# Altium footprint library Connectors.PcbLib: 408 footprints (part 13 of 26)
Each footprint in its own frame and in the unit in brackets; x right, y up, seen from the top. Pads: shape width x height; smd on the part's side, far side on the other; paste and mask are expansions set on the pad; w line width, h text height; cw(c..) or ccw(c..) is an arc to the next point about the centre after c.
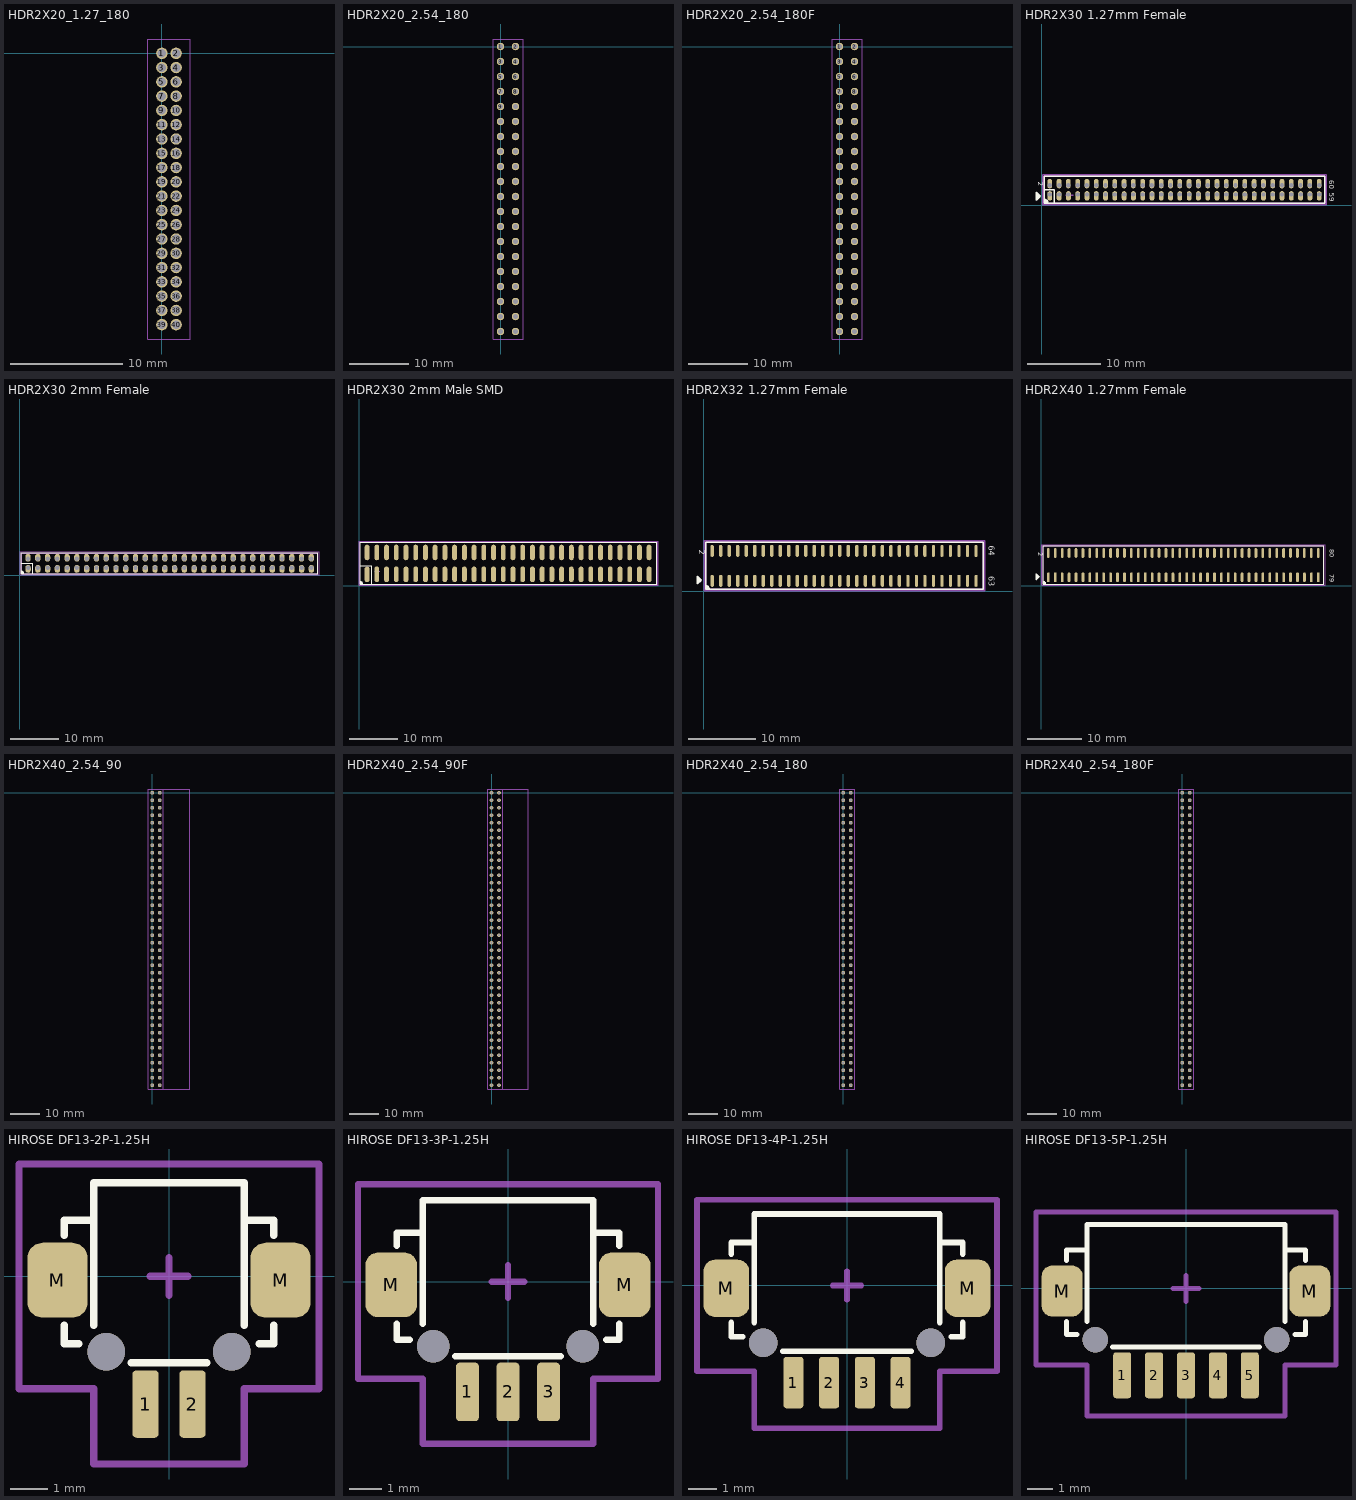
[diagram p12: the footprints below, top view; thin cyan lines are the x and y axes]

## HDR2X20_1.27_180 [mil]
height 169.29
pads (40):
  round 40 hole 30: 1(0,0) 2(50,0) 3(0,-50) 4(50,-50) 5(0,-100) 6(50,-100) 7(0,-150) 8(50,-150) 9(0,-200) 10(50,-200) 11(0,-250) 12(50,-250) 13(0,-300) 14(50,-300) 15(0,-350) 16(50,-350) 17(0,-400) 18(50,-400) 19(0,-450) 20(50,-450) 21(0,-500) 22(50,-500) 23(0,-550) 24(50,-550) 25(0,-600) 26(50,-600) 27(0,-650) 28(50,-650) 29(0,-700) 30(50,-700) 31(0,-750) 32(50,-750) 33(0,-800) 34(50,-800) 35(0,-850) 36(49.99,-850) 37(-0.01,-900) 38(49.99,-900) 39(-0.01,-950) 40(49.99,-950)
Mechanical 13:
  lines w2: -50,-1000 100,-1000 100,50 -50,50 -50,-1000
Mechanical 14:
  lines w2: -50,-1000 100,-1000 100,50 -50,50 -50,-1000
  text ".Designator" at -6,-495 h80

## HDR2X20_2.54_180 [mil]
height 169.29
pads (40):
  round 50 hole 32: 1(0,0) 2(100,0) 3(0,-100) 4(100,-100) 5(0,-200) 6(100,-200) 7(0,-300) 8(100,-300) 9(0,-400) 10(100,-400) 11(0,-500) 12(100,-500) 13(0,-600) 14(100,-600) 15(0,-700) 16(100,-700) 17(0,-800) 18(100,-800) 19(0,-900) 20(100,-900) 21(0,-1000) 22(100,-1000) 23(0,-1100) 24(100,-1100) 25(0,-1200) 26(100,-1200) 27(0,-1300) 28(100,-1300) 29(0,-1400) 30(100,-1400) 31(0,-1500) 32(100,-1500) 33(0,-1600) 34(100,-1600) 35(0,-1700) 36(100,-1700) 37(0,-1800) 38(100,-1800) 39(0,-1900) 40(100,-1900)
Mechanical 13:
  lines w2: -50,-1950 -50,50 150,50 150,-1950 -50,-1950
Mechanical 14:
  lines w2: -50,-1950 -50,50 150,50 150,-1950 -50,-1950
  text ".Designator" at 19,-970 h80
3D body "pin_header_awl254-dg-g40d.stp": height 334.65, standoff -118.11, extent -49.99,-1950 150.01,50

## HDR2X20_2.54_180F [mil]
height 169.29
pads (40):
  round 50 hole 32: 1(0,0) 2(100,0) 3(0,-100) 4(100,-100) 5(0,-200) 6(100,-200) 7(0,-300) 8(100,-300) 9(0,-400) 10(100,-400) 11(0,-500) 12(100,-500) 13(0,-600) 14(100,-600) 15(0,-700) 16(100,-700) 17(0,-800) 18(100,-800) 19(0,-900) 20(100,-900) 21(0,-1000) 22(100,-1000) 23(0,-1100) 24(100,-1100) 25(0,-1200) 26(100,-1200) 27(0,-1300) 28(100,-1300) 29(0,-1400) 30(100,-1400) 31(0,-1500) 32(100,-1500) 33(0,-1600) 34(100,-1600) 35(0,-1700) 36(100,-1700) 37(0,-1800) 38(100,-1800) 39(0,-1900) 40(100,-1900)
Mechanical 13:
  lines w2: -50,-1950 -50,50 150,50 150,-1950 -50,-1950
Mechanical 14:
  lines w2: -50,-1950 150,-1950 150,50 -50,50 -50,-1950
  text ".Designator" at 19,-970 h80
3D body "female_header_a-bl254-dg-g40d.stp": height 334.65, standoff -125.98, extent -48.42,-1954.92 148.43,54.92

## HDR2X30 1.27mm Female [mm]
pads (60):
  oval 0.65x1.3 hole 0.6 copper offset 0,-0.2: 1(1.09,1.5) 3(2.36,1.5) 5(3.631,1.5) 7(4.901,1.5) 9(6.171,1.5) 11(7.442,1.5) 13(8.712,1.5) 15(9.982,1.5) 17(11.253,1.5) 19(12.523,1.5) 21(13.793,1.5) 23(15.064,1.5) 25(16.334,1.5) 27(17.604,1.5) 29(18.875,1.5) 31(20.145,1.5) 33(21.415,1.5) 35(22.686,1.5) 37(23.956,1.5) 39(25.226,1.5) 41(26.497,1.5) 43(27.767,1.5) 45(29.037,1.5) 47(30.308,1.5) 49(31.578,1.5) 51(32.848,1.5) 53(34.119,1.5) 55(35.389,1.5) 57(36.659,1.5) 59(37.93,1.5)
  oval 0.65x1.3 hole 0.6 copper offset 0,0.2: 2(1.083,2.78) 4(2.354,2.78) 6(3.624,2.78) 8(4.894,2.78) 10(6.165,2.78) 12(7.435,2.78) 14(8.705,2.78) 16(9.976,2.78) 18(11.246,2.78) 20(12.516,2.78) 22(13.787,2.78) 24(15.057,2.78) 26(16.327,2.78) 28(17.598,2.78) 30(18.868,2.78) 32(20.138,2.78) 34(21.409,2.78) 36(22.679,2.78) 38(23.949,2.78) 40(25.22,2.78) 42(26.49,2.78) 44(27.76,2.78) 46(29.031,2.78) 48(30.301,2.78) 50(31.571,2.78) 52(32.842,2.78) 54(34.112,2.78) 56(35.382,2.78) 58(36.653,2.78) 90(37.923,2.78)
Top Overlay:
  rectangle: -0.73,0.92 -0.48,1.65
  rectangle: -0.56,1.06 -0.31,1.5
  region: 0.25,0.3 0.25,0.78 0.5,0.78 0.79,0.49 0.79,0.3
  lines w0.2: 0.3,0.82 cw(c0.3,0.32) 0.8,0.32 ; 0.3,2.15 1.73,2.15 1.73,0.37 ; 0.34,0.64 0.37,0.64 cw(c0.37,0.3) 0.71,0.3 ; -0.74,0.72 -0.19,1.27 -0.74,1.82 -0.74,0.72 ; 0.3,0.3 0.3,3.99 38.69,3.99 38.69,0.3 0.3,0.3
  text "2" at -0.8,3.22 h1.2
  text "60" at 39.03,3.47 h1.2
  text "59" at 39.03,1.73 h1.2
Mechanical 13:
  lines w0.2: 0.32,0.31 38.69,0.31 38.69,3.97 0.32,3.97 0.32,0.31
Mechanical 15:
  lines w0.2: 3.28,1.36 4.28,1.36 ; 3.78,0.86 3.78,1.86 ; 0.09,0.08 0.09,4.21 38.91,4.21 38.91,0.08 0.09,0.08
3D body "2002111100060T4LF.stp": height 5.5, standoff -2.35, extent 0.46,0.44 38.56,3.84

## HDR2X30 2mm Female [mm]
pads (60):
  oval 1.1x1.6 hole 0.9 copper offset 0,-0.2: 1(1.666,1.51) 3(3.674,1.51) 5(5.683,1.51) 7(7.691,1.51) 9(9.699,1.51) 11(11.708,1.51) 13(13.716,1.51) 15(15.724,1.51) 17(17.733,1.51) 19(19.741,1.51) 21(21.749,1.51) 23(23.758,1.51) 25(25.766,1.51) 27(27.774,1.51) 29(29.783,1.51) 31(31.791,1.51) 33(33.806,1.51) 35(35.814,1.51) 37(37.823,1.51) 39(39.831,1.51) 41(41.839,1.51) 43(43.848,1.51) 45(45.856,1.51) 47(47.864,1.51) 49(49.873,1.51) 51(51.881,1.51) 53(53.889,1.51) 55(55.898,1.51) 57(57.906,1.51) 59(59.914,1.51)
  oval 1.1x1.6 hole 0.9 copper offset 0,0.2: 2(1.66,3.4) 4(3.669,3.4) 6(5.677,3.4) 8(7.685,3.4) 10(9.694,3.4) 12(11.702,3.4) 14(13.71,3.4) 16(15.719,3.4) 18(17.727,3.4) 20(19.735,3.4) 22(21.744,3.4) 24(23.752,3.4) 26(25.76,3.4) 28(27.769,3.4) 30(29.777,3.4) 32(31.785,3.4) 34(33.8,3.4) 36(35.809,3.4) 38(37.817,3.4) 40(39.825,3.4) 42(41.834,3.4) 44(43.842,3.4) 46(45.85,3.4) 48(47.859,3.4) 50(49.867,3.4) 52(51.875,3.4) 54(53.884,3.4) 56(55.892,3.4) 58(57.9,3.4) 60(59.909,3.4)
Top Overlay:
  region: 0.25,0.3 0.25,0.78 0.5,0.78 0.79,0.49 0.79,0.3
  lines w0.2: 0.3,0.82 cw(c0.3,0.32) 0.8,0.32 ; 0.3,2.465 2.665,2.465 2.665,0.37 ; 0.34,0.64 0.37,0.64 cw(c0.37,0.3) 0.71,0.3 ; 0.3,0.3 61.268,0.3 61.268,4.59 0.3,4.59 0.3,0.3
Bottom Overlay:
  region: 0.25,0.3 0.25,0.78 0.5,0.78 0.79,0.49 0.79,0.3
  lines w0.2: 0.3,0.82 cw(c0.3,0.32) 0.8,0.32 ; 0.3,2.465 2.665,2.465 2.665,0.37 ; 0.34,0.64 0.37,0.64 cw(c0.37,0.3) 0.71,0.3 ; 0.3,0.3 61.27,0.3 61.27,4.59 0.3,4.59 0.3,0.3
Mechanical 13:
  lines w0.2: 0.32,0.31 0.32,4.57 61.276,4.57 61.276,0.31 0.32,0.31
Mechanical 15:
  lines w0.2: 3.28,1.36 4.28,1.36 ; 3.78,0.86 3.78,1.86 ; 0.09,0.08 61.484,0.08 61.484,4.8 0.09,4.8 0.09,0.08
3D body "62003221821.stp": height 4.35, standoff -2.65, extent 0.44,0.44 33.04,4.44
3D body "62002821821.stp": height 4.35, standoff -2.65, extent 32.528,0.443 61.128,4.443

## HDR2X30 2mm Male SMD [mm]
pads (60):
  oval 1x3.2 smd: 1(1.658,2.341) 2(1.658,6.841) 3(3.658,2.341) 4(3.658,6.841) 5(5.658,2.341) 6(5.658,6.841) 7(7.658,2.341) 8(7.658,6.841) 9(9.658,2.341) 10(9.658,6.841) 11(11.658,2.341) 12(11.658,6.841) 13(13.658,2.341) 14(13.658,6.841) 15(15.658,2.341) 16(15.658,6.841) 17(17.658,2.341) 18(17.658,6.841) 19(19.657,2.341) 20(19.657,6.841) 21(21.657,2.341) 22(21.657,6.841) 23(23.657,2.341) 24(23.657,6.841) 25(25.657,2.341) 26(25.657,6.841) 27(27.657,2.341) 28(27.657,6.841) 29(29.657,2.341) 30(29.657,6.841) 31(31.657,2.341) 32(31.657,6.841) 33(33.657,2.341) 34(33.657,6.841) 35(35.657,2.341) 36(35.657,6.841) 37(37.657,2.341) 38(37.657,6.841) 39(39.657,2.341) 40(39.657,6.841) 41(41.657,2.341) 42(41.657,6.841) 43(43.657,2.341) 44(43.657,6.841) 45(45.657,2.341) 46(45.657,6.841) 47(47.657,2.341) 48(47.657,6.841) 49(49.657,2.341) 50(49.657,6.841) 51(51.657,2.341) 52(51.657,6.841) 53(53.657,2.341) 54(53.657,6.841) 55(55.657,2.341) 56(55.657,6.841) 57(57.656,2.341) 58(57.656,6.841) 59(59.656,2.341) 60(59.656,6.841)
Top Overlay:
  region: 0.242,0.301 0.242,0.781 0.492,0.781 0.782,0.491 0.782,0.301
  lines w0.2: 0.292,0.821 cw(c0.292,0.321) 0.792,0.321 ; 0.292,4.138 2.657,4.138 2.657,0.371 ; 0.332,0.641 0.362,0.641 cw(c0.362,0.301) 0.702,0.301 ; 0.292,0.301 0.292,8.928 61.26,8.928 61.26,0.301 0.292,0.301
Mechanical 13:
  lines w0.2: 0.104,0.082 61.46,0.082 61.46,9.114 0.104,9.114 0.104,0.082
Mechanical 15:
  lines w0.2: 3.272,3.001 4.272,3.001 ; 3.772,2.501 3.772,3.501 ; 0.082,0.082 0.082,9.12 61.476,9.12 61.476,0.082 0.082,0.082
3D body "User Library-pin_header_a-sl200-dg-g12mp1.STEP": height 6.5, standoff 0, extent 0.693,1.342 12.643,7.842
3D body "User Library-pin_header_a-sl200-dg-g12mp1.STEP": height 6.5, standoff 0, extent 10.715,1.338 22.665,7.838
3D body "User Library-pin_header_a-sl200-dg-g12mp1.STEP": height 6.5, standoff 0, extent 30.709,1.336 42.659,7.836
3D body "User Library-pin_header_a-sl200-dg-g12mp1.STEP": height 6.5, standoff 0, extent 20.767,1.34 32.717,7.84
3D body "User Library-pin_header_a-sl200-dg-g12mp1.STEP": height 6.5, standoff 0, extent 48.685,1.315 60.635,7.815
3D body "User Library-pin_header_a-sl200-dg-g12mp1.STEP": height 6.5, standoff 0, extent 40.71,1.319 52.66,7.819

## HDR2X32 1.27mm Female [mm]
pads (64):
  oval 0.5x1.8 smd: 1(1.266,1.566) 2(1.26,6.031) 3(2.536,1.566) 4(2.53,6.031) 5(3.806,1.566) 6(3.8,6.031) 7(5.076,1.566) 8(5.07,6.031) 9(6.346,1.566) 10(6.34,6.031) 11(7.617,1.566) 12(7.61,6.031) 13(8.887,1.566) 14(8.88,6.031) 15(10.157,1.566) 16(10.15,6.031) 17(11.427,1.566) 18(11.42,6.031) 19(12.697,1.566) 20(12.69,6.031) 21(13.967,1.566) 22(13.96,6.031) 23(15.237,1.566) 24(15.23,6.031) 25(16.507,1.566) 26(16.5,6.031) 27(17.777,1.566) 28(17.77,6.031) 29(19.047,1.566) 30(19.04,6.031) 31(20.317,1.566) 32(20.31,6.031) 33(21.587,1.566) 34(21.58,6.031) 35(22.857,1.566) 36(22.85,6.031) 37(24.127,1.566) 38(24.12,6.031) 39(25.397,1.566) 40(25.39,6.031) 41(26.667,1.566) 42(26.66,6.031) 43(27.937,1.566) 44(27.931,6.031) 45(29.207,1.566) 46(29.201,6.031) 47(30.477,1.566) 48(30.471,6.031) 49(31.747,1.566) 50(31.741,6.031) 51(33.017,1.566) 52(33.011,6.031) 53(34.287,1.566) 54(34.281,6.031) 55(35.557,1.566) 56(35.551,6.031) 57(36.827,1.566) 58(36.821,6.031) 59(38.098,1.566) 60(38.091,6.031) 61(39.368,1.566) 62(39.361,6.031) 63(40.638,1.566) 64(40.631,6.031)
Top Overlay:
  rectangle: -0.745,1.471 -0.495,1.911
  rectangle: -0.915,1.331 -0.665,2.061
  region: 0.25,0.3 0.25,0.78 0.5,0.78 0.79,0.49 0.79,0.3
  lines w0.2: 0.3,0.82 cw(c0.3,0.32) 0.8,0.32 ; 0.34,0.64 0.37,0.64 cw(c0.37,0.3) 0.71,0.3 ; -0.925,1.131 -0.925,2.231 -0.375,1.681 -0.925,1.131 ; 0.3,0.3 41.689,0.3 41.689,7.343 0.3,7.343 0.3,0.3
  text "63" at 42.267,2.222 h1.5
  text "64" at 42.267,6.822 h1.5
  text "2" at -0.998,6.186 h1.5
Mechanical 13:
  lines w0.2: 0.32,0.31 0.32,7.314 41.705,7.314 41.705,0.31 0.32,0.31
Mechanical 15:
  lines w0.2: 0.09,0.08 41.923,0.08 41.923,7.562 0.09,7.562 0.09,0.08
3D body "User Library-PLLD1_27-xx-S.STEP": height 3.9, standoff 0, extent 0.636,1.331 41.276,6.331

## HDR2X40 1.27mm Female [mm]
pads (80):
  oval 0.5x1.8 smd: 1(1.266,1.566) 2(1.26,6.031) 3(2.536,1.566) 4(2.53,6.031) 5(3.806,1.566) 6(3.8,6.031) 7(5.076,1.566) 8(5.07,6.031) 9(6.346,1.566) 10(6.34,6.031) 11(7.617,1.566) 12(7.61,6.031) 13(8.887,1.566) 14(8.88,6.031) 15(10.157,1.566) 16(10.15,6.031) 17(11.427,1.566) 18(11.42,6.031) 19(12.697,1.566) 20(12.69,6.031) 21(13.967,1.566) 22(13.96,6.031) 23(15.237,1.566) 24(15.23,6.031) 25(16.507,1.566) 26(16.5,6.031) 27(17.777,1.566) 28(17.77,6.031) 29(19.047,1.566) 30(19.04,6.031) 31(20.317,1.566) 32(20.31,6.031) 33(21.587,1.566) 34(21.58,6.031) 35(22.857,1.566) 36(22.85,6.031) 37(24.127,1.566) 38(24.12,6.031) 39(25.397,1.566) 40(25.39,6.031) 41(26.667,1.566) 42(26.66,6.031) 43(27.937,1.566) 44(27.931,6.031) 45(29.207,1.566) 46(29.201,6.031) 47(30.477,1.566) 48(30.471,6.031) 49(31.747,1.566) 50(31.741,6.031) 51(33.017,1.566) 52(33.011,6.031) 53(34.287,1.566) 54(34.281,6.031) 55(35.557,1.566) 56(35.551,6.031) 57(36.827,1.566) 58(36.821,6.031) 59(38.098,1.566) 61(39.368,1.566) 62(39.361,6.031) 63(40.638,1.566) 64(40.631,6.031) 65(41.908,1.566) 66(41.901,6.031) 67(43.178,1.566) 68(43.171,6.031) 69(44.448,1.566) 70(44.441,6.031) 71(45.718,1.566) 72(45.711,6.031) 73(46.988,1.566) 74(46.981,6.031) 75(48.258,1.566) 76(48.251,6.031) 77(49.528,1.566) 78(49.521,6.031) 79(50.798,1.566) 80(50.791,6.031) 90(38.091,6.031)
Top Overlay:
  rectangle: -0.745,1.471 -0.495,1.911
  rectangle: -0.915,1.331 -0.665,2.061
  region: 0.25,0.3 0.25,0.78 0.5,0.78 0.79,0.49 0.79,0.3
  lines w0.2: 0.3,0.82 cw(c0.3,0.32) 0.8,0.32 ; 0.34,0.64 0.37,0.64 cw(c0.37,0.3) 0.71,0.3 ; -0.925,1.131 -0.925,2.231 -0.375,1.681 -0.925,1.131 ; 0.3,0.3 51.794,0.3 51.794,7.343 0.3,7.343 0.3,0.3
  text "79" at 52.558,2.1 h1.5
  text "80" at 52.558,6.7 h1.5
  text "2" at -0.998,6.186 h1.5
Mechanical 13:
  lines w0.2: 0.32,0.31 0.32,7.314 51.794,7.314 51.794,0.31 0.32,0.31
Mechanical 15:
  lines w0.2: 0.09,0.08 52.07,0.08 52.07,7.562 0.09,7.562 0.09,0.08
3D body "User Library-PLLD1_27-xx-SPLLD1_27-80-S.STEP": height 3.9, standoff 0, extent 0.645,1.271 51.445,6.271

## HDR2X40_2.54_90 [mil]
height 169.29
pads (80):
  round 50 hole 32: 1(0,0) 2(100,0) 3(0,-100) 4(100,-100) 5(0,-200) 6(100,-200) 7(0,-300) 8(100,-300) 9(0,-400) 10(100,-400) 11(0,-500) 12(100,-500) 13(0,-600) 14(100,-600) 15(0,-700) 16(100,-700) 17(0,-800) 18(100,-800) 19(0,-900) 20(100,-900) 21(0,-1000) 22(100,-1000) 23(0,-1100) 24(100,-1100) 25(0,-1200) 26(100,-1200) 27(0,-1300) 28(100,-1300) 29(0,-1400) 30(100,-1400) 31(0,-1500) 32(100,-1500) 33(0,-1600) 34(100,-1600) 35(0,-1700) 36(100,-1700) 37(0,-1800) 38(100,-1800) 39(0,-1900) 40(100,-1900) 41(0,-2000) 42(100,-2000) 43(0,-2100) 44(100,-2100) 45(0,-2200) 46(100,-2200) 47(0,-2300) 48(100,-2300) 49(0,-2400) 50(100,-2400) 51(0,-2500) 52(100,-2500) 53(0,-2600) 54(100,-2600) 55(0,-2700) 56(100,-2700) 57(0,-2800) 58(100,-2800) 59(0,-2900) 60(100,-2900) 61(0,-3000) 62(100,-3000) 63(0,-3100) 64(100,-3100) 65(0,-3200) 66(100,-3200) 67(0,-3300) 68(100,-3300) 69(0,-3400) 70(100,-3400) 71(0,-3500) 72(100,-3500) 73(0,-3600) 74(100,-3600) 75(0,-3700) 76(100,-3700) 77(0,-3800) 78(100,-3800) 79(0,-3900) 80(100,-3900)
Mechanical 13:
  lines w2: -50,-3950 500,-3950 500,50 -50,50 -50,-3950
Mechanical 14:
  lines w2: -50,-3950 -50,50 150,50 150,-3950 -50,-3950
  text ".Designator" at 19,-1970 h80
3D body "pin_header_awl254-da-g80d.stp": height 198.43, standoff -116.54, extent -12.44,-3945 494.64,55

## HDR2X40_2.54_90F [mil]
height 169.29
pads (80):
  round 50 hole 32: 1(0,0) 2(100,0) 3(0,-100) 4(100,-100) 5(0,-200) 6(100,-200) 7(0,-300) 8(100,-300) 9(0,-400) 10(100,-400) 11(0,-500) 12(100,-500) 13(0,-600) 14(100,-600) 15(0,-700) 16(100,-700) 17(0,-800) 18(100,-800) 19(0,-900) 20(100,-900) 21(0,-1000) 22(100,-1000) 23(0,-1100) 24(100,-1100) 25(0,-1200) 26(100,-1200) 27(0,-1300) 28(100,-1300) 29(0,-1400) 30(100,-1400) 31(0,-1500) 32(100,-1500) 33(0,-1600) 34(100,-1600) 35(0,-1700) 36(100,-1700) 37(0,-1800) 38(100,-1800) 39(0,-1900) 40(100,-1900) 41(0,-2000) 42(100,-2000) 43(0,-2100) 44(100,-2100) 45(0,-2200) 46(100,-2200) 47(0,-2300) 48(100,-2300) 49(0,-2400) 50(100,-2400) 51(0,-2500) 52(100,-2500) 53(0,-2600) 54(100,-2600) 55(0,-2700) 56(100,-2700) 57(0,-2800) 58(100,-2800) 59(0,-2900) 60(100,-2900) 61(0,-3000) 62(100,-3000) 63(0,-3100) 64(100,-3100) 65(0,-3200) 66(100,-3200) 67(0,-3300) 68(100,-3300) 69(0,-3400) 70(100,-3400) 71(0,-3500) 72(100,-3500) 73(0,-3600) 74(100,-3600) 75(0,-3700) 76(100,-3700) 77(0,-3800) 78(100,-3800) 79(0,-3900) 80(100,-3900)
Mechanical 13:
  lines w2: -50,-3950 -50,50 490,50 490,-3950 -50,-3950
Mechanical 14:
  lines w2: -50,-3950 150,-3950 150,50 -50,50 -50,-3950
  text ".Designator" at 19,-1970 h80
3D body "female_header_a-bl254-da-g80d.stp": height 198.43, standoff -124.41, extent -10,-3949.92 486.06,59.92

## HDR2X40_2.54_180 [mil]
height 169.29
pads (80):
  round 50 hole 32: 1(0,0) 2(100,0) 3(0,-100) 4(100,-100) 5(0,-200) 6(100,-200) 7(0,-300) 8(100,-300) 9(0,-400) 10(100,-400) 11(0,-500) 12(100,-500) 13(0,-600) 14(100,-600) 15(0,-700) 16(100,-700) 17(0,-800) 18(100,-800) 19(0,-900) 20(100,-900) 21(0,-1000) 22(100,-1000) 23(0,-1100) 24(100,-1100) 25(0,-1200) 26(100,-1200) 27(0,-1300) 28(100,-1300) 29(0,-1400) 30(100,-1400) 31(0,-1500) 32(100,-1500) 33(0,-1600) 34(100,-1600) 35(0,-1700) 36(100,-1700) 37(0,-1800) 38(100,-1800) 39(0,-1900) 40(100,-1900) 41(0,-2000) 42(100,-2000) 43(0,-2100) 44(100,-2100) 45(0,-2200) 46(100,-2200) 47(0,-2300) 48(100,-2300) 49(0,-2400) 50(100,-2400) 51(0,-2500) 52(100,-2500) 53(0,-2600) 54(100,-2600) 55(0,-2700) 56(100,-2700) 57(0,-2800) 58(100,-2800) 59(0,-2900) 60(100,-2900) 61(0,-3000) 62(100,-3000) 63(0,-3100) 64(100,-3100) 65(0,-3200) 66(100,-3200) 67(0,-3300) 68(100,-3300) 69(0,-3400) 70(100,-3400) 71(0,-3500) 72(100,-3500) 73(0,-3600) 74(100,-3600) 75(0,-3700) 76(100,-3700) 77(0,-3800) 78(100,-3800) 79(0,-3900) 80(100,-3900)
Mechanical 13:
  lines w2: -50,-3950 150,-3950 150,50 -50,50 -50,-3950
Mechanical 14:
  lines w2: -50,-3950 -50,50 150,50 150,-3950 -50,-3950
  text ".Designator" at 19,-1970 h80

## HDR2X40_2.54_180F [mil]
height 169.29
pads (80):
  round 50 hole 32: 1(0,0) 2(100,0) 3(0,-100) 4(100,-100) 5(0,-200) 6(100,-200) 7(0,-300) 8(100,-300) 9(0,-400) 10(100,-400) 11(0,-500) 12(100,-500) 13(0,-600) 14(100,-600) 15(0,-700) 16(100,-700) 17(0,-800) 18(100,-800) 19(0,-900) 20(100,-900) 21(0,-1000) 22(100,-1000) 23(0,-1100) 24(100,-1100) 25(0,-1200) 26(100,-1200) 27(0,-1300) 28(100,-1300) 29(0,-1400) 30(100,-1400) 31(0,-1500) 32(100,-1500) 33(0,-1600) 34(100,-1600) 35(0,-1700) 36(100,-1700) 37(0,-1800) 38(100,-1800) 39(0,-1900) 40(100,-1900) 41(0,-2000) 42(100,-2000) 43(0,-2100) 44(100,-2100) 45(0,-2200) 46(100,-2200) 47(0,-2300) 48(100,-2300) 49(0,-2400) 50(100,-2400) 51(0,-2500) 52(100,-2500) 53(0,-2600) 54(100,-2600) 55(0,-2700) 56(100,-2700) 57(0,-2800) 58(100,-2800) 59(0,-2900) 60(100,-2900) 61(0,-3000) 62(100,-3000) 63(0,-3100) 64(100,-3100) 65(0,-3200) 66(100,-3200) 67(0,-3300) 68(100,-3300) 69(0,-3400) 70(100,-3400) 71(0,-3500) 72(100,-3500) 73(0,-3600) 74(100,-3600) 75(0,-3700) 76(100,-3700) 77(0,-3800) 78(100,-3800) 79(0,-3900) 80(100,-3900)
Mechanical 14:
  lines w2: -50,-3950 -50,50 150,50 150,-3950 -50,-3950
  text ".Designator" at 19,-1970 h80
3D body "female_header_a-bl254-dg-g80d.stp": height 334.65, standoff -125.98, extent -48.42,-3954.92 148.43,54.93

## HIROSE DF13-2P-1.25H [mm] "DF13 Series 1.25mm pitch miniature crimping connector single row"
height 3.6
pads (4):
  rrect30% 0.7x1.8 smd: 1(-0.625,-3.4) 2(0.625,-3.4)
  rrect50% 1.6x2 smd: M(-2.975,-0.1) M(2.975,-0.1)
via 1.675,-2 diameter 1 hole 1
via -1.675,-2 diameter 1 hole 1
Top Overlay:
  lines w0.2: -2.8,-1.3 -2.8,-1.8 -2.4,-1.8 ; -2.8,1.1 -2.8,1.5 -2,1.5 ; -2,-1.3 -2,2.5 0,2.5 2,2.5 2,-1.3 ; -1,-2.3 0,-2.3 1,-2.3 ; 2,1.5 2.8,1.5 2.8,1.1 ; 2.4,-1.8 2.8,-1.8 2.8,-1.3
Mechanical 15:
  lines w0.2: -0.5,0 0.5,0 ; 0,-0.5 0,0.5 ; -4,-3 -2,-3 -2,-5 0,-5 2,-5 2,-3 4,-3 4,2.5 4,3 0,3 -4,3 -4,2.5 -4,-3
3D body "DF13-2P-1.25H_X_8A_S_H_X_97_S__.STEP": height 3.59, standoff -0.81, extent -3.575,-3.9 3.575,2.6

## HIROSE DF13-3P-1.25H [mm] "DF13 Series 1.25mm pitch miniature crimping connector single row"
height 3.6
pads (5):
  rrect30% 0.7x1.8 smd: 1(-1.25,-3.4) 2(0,-3.4) 3(1.25,-3.4)
  rrect50% 1.6x2 smd: M(-3.6,-0.1) M(3.6,-0.1)
via -2.3,-2 diameter 1 hole 1
via 2.3,-2 diameter 1 hole 1
Top Overlay:
  lines w0.2: -3.425,-1.3 -3.425,-1.8 -3.025,-1.8 ; -3.425,1.1 -3.425,1.5 -2.625,1.5 ; -2.625,-1.3 -2.625,2.5 -0.625,2.5 1.375,2.5 2.625,2.5 2.625,-1.3 ; -1.625,-2.3 -0.625,-2.3 0,-2.3 0.625,-2.3 1.625,-2.3 ; 2.625,1.5 3.425,1.5 3.425,1.1 ; 3.025,-1.8 3.425,-1.8 3.425,-1.3
Mechanical 15:
  lines w0.2: -0.5,0 0.5,0 ; 0,-0.5 0,0.5 ; -4.625,-3 -4.625,2.5 -4.625,3 -0.625,3 3.375,3 4.625,3 4.625,2.5 4.625,-3 2.625,-3 2.625,-5 -0.625,-5 -2.625,-5 -2.625,-3 -4.625,-3
3D body "DF13-3P-1.25H_X_8A_S_H_X_97_S__.STEP": height 3.59, standoff -0.81, extent -4.2,-3.9 4.2,2.6

## HIROSE DF13-4P-1.25H [mm] "DF13 Series 1.25mm pitch miniature crimping connector single row"
height 3.6
pads (6):
  rrect30% 0.7x1.8 smd: 1(-1.875,-3.4) 2(-0.625,-3.4) 3(0.625,-3.4) 4(1.875,-3.4)
  rrect50% 1.6x2 smd: M(-4.225,-0.1) M(4.225,-0.1)
via 2.925,-2 diameter 1 hole 1
via -2.925,-2 diameter 1 hole 1
Top Overlay:
  lines w0.2: -4.05,-1.3 -4.05,-1.8 -3.65,-1.8 ; -4.05,1.1 -4.05,1.5 -3.25,1.5 ; -3.25,-1.3 -3.25,2.5 -1.25,2.5 2,2.5 3.25,2.5 3.25,-1.3 ; -2.25,-2.3 -1.25,-2.3 -0.625,-2.3 1.25,-2.3 2.25,-2.3 ; 3.25,1.5 4.05,1.5 4.05,1.1 ; 3.65,-1.8 4.05,-1.8 4.05,-1.3
Mechanical 15:
  lines w0.2: -0.5,0 0.5,0 ; 0,-0.5 0,0.5 ; -5.25,-3 -3.25,-3 -3.25,-5 -1.25,-5 3.25,-5 3.25,-3 5.25,-3 5.25,2.5 5.25,3 4,3 -1.25,3 -5.25,3 -5.25,2.5 -5.25,-3
3D body "DF13-4P-1.25H_X_8A_S_H_X_97_S__.STEP": height 3.59, standoff -0.81, extent -4.825,-3.9 4.825,2.6

## HIROSE DF13-5P-1.25H [mm] "DF13 Series 1.25mm pitch miniature crimping connector single row"
height 3.6
pads (7):
  rrect30% 0.7x1.8 smd: 1(-2.5,-3.4) 2(-1.25,-3.4) 3(0,-3.4) 4(1.25,-3.4) 5(2.5,-3.4)
  rrect50% 1.6x2 smd: M(-4.85,-0.1) M(4.85,-0.1)
via -3.55,-2 diameter 1 hole 1
via 3.55,-2 diameter 1 hole 1
Top Overlay:
  lines w0.2: -4.675,-1.3 -4.675,-1.8 -4.275,-1.8 ; -4.675,1.1 -4.675,1.5 -3.875,1.5 ; -3.875,-1.3 -3.875,2.5 -1.875,2.5 2.625,2.5 3.875,2.5 3.875,-1.3 ; -2.875,-2.3 -1.875,-2.3 -1.25,-2.3 1.875,-2.3 2.875,-2.3 ; 3.875,1.5 4.675,1.5 4.675,1.1 ; 4.275,-1.8 4.675,-1.8 4.675,-1.3
Mechanical 15:
  lines w0.2: -0.5,0 0.5,0 ; 0,-0.5 0,0.5 ; -5.875,-3 -5.875,2.5 -5.875,3 -1.875,3 4.625,3 5.875,3 5.875,2.5 5.875,-3 3.875,-3 3.875,-5 -1.875,-5 -3.875,-5 -3.875,-3 -5.875,-3
3D body "DF13-5P-1.25H_X_8A_S_H_X_97_S__.STEP": height 3.59, standoff -0.81, extent -5.45,-3.9 5.45,2.6